# Altium footprint library Connectors Pad Lib.PcbLib: 211 footprints (part 11 of 14)
Each footprint in its own frame and in the unit in brackets; x right, y up, seen from the top. Pads: shape width x height; smd on the part's side, far side on the other; paste and mask are expansions set on the pad; w line width, h text height; cw(c..) or ccw(c..) is an arc to the next point about the centre after c.
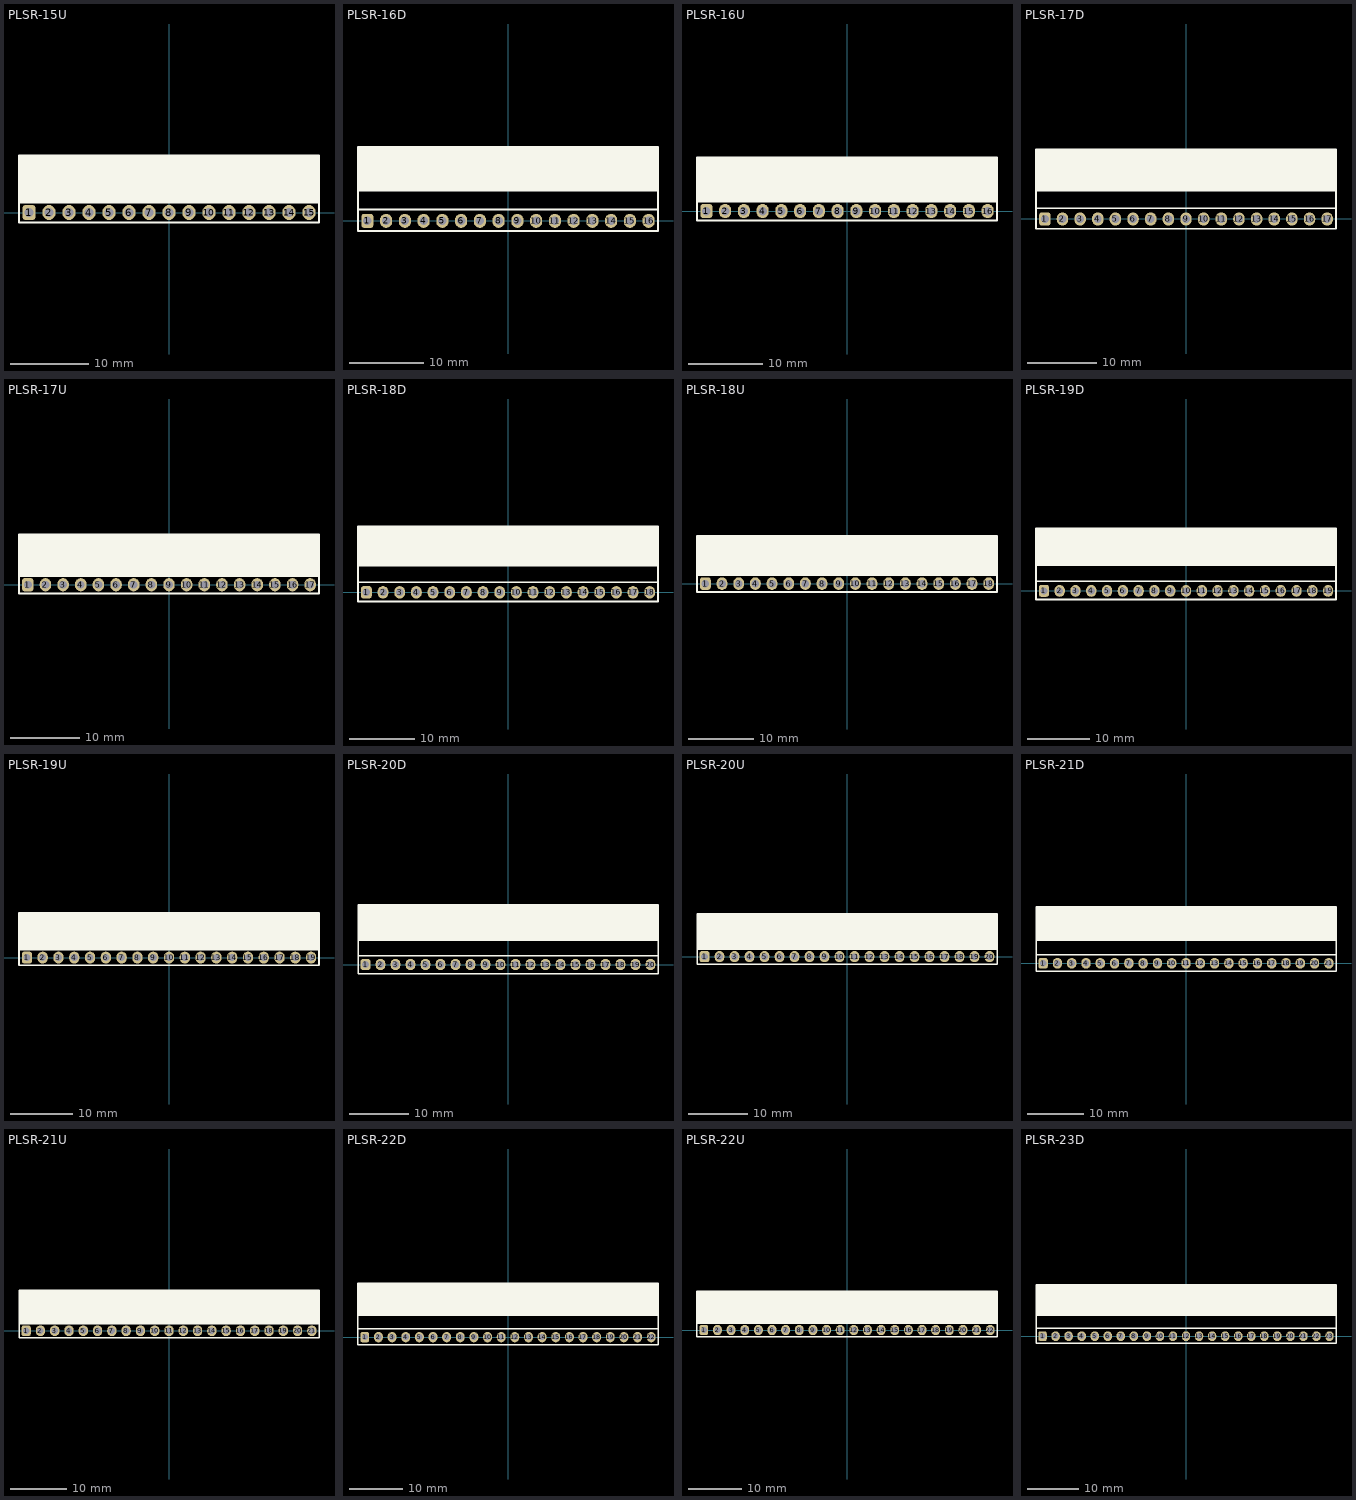
[diagram p10: the footprints below, top view; thin cyan lines are the x and y axes]

## PLSR-15U [mil] "PCB Right Angled Single Connector (U Type) 15-Pin"
height 236.3
pads (15):
  rrect50% 65x75 hole 45: 1(-700,0)
  oval 65x75 hole 45: 2(-600,0) 3(-500,0) 4(-400,0) 5(-300,0) 6(-200,0) 7(-100,0) 8(0,0) 9(100,0) 10(200,0) 11(300,0) 12(400,0) 13(500,0) 14(600,0) 15(700,0)
Top Overlay:
  rectangle: -750,50 750,285
  lines w10: -750,50 750,50 ; -750,-50 -750,285 750,285 750,-50 -750,-50
3D body "PLSRU-15.STEP": height 239.98, standoff -117.11, extent -750,-50 750,286.22

## PLSR-16D [mil] "PCB Right Angled Single Connector (D Type) 16-Pin"
height 98.42
pads (16):
  rrect50% 65x75 hole 45: 1(-750,0)
  oval 65x75 hole 45: 2(-650,0) 3(-550,0) 4(-450,0) 5(-350,0) 6(-250,0) 7(-150,0) 8(-50,0) 9(50,0) 10(150,0) 11(250,0) 12(350,0) 13(450,0) 14(550,0) 15(650,0) 16(750,0)
Top Overlay:
  rectangle: -800,161 800,395
  lines w10: -800,61 800,61 ; -800,161 800,161 ; -800,-55 800,-55 800,395 -800,395 -800,-55
3D body "PLSR-16D.STEP": height 101, standoff -117.11, extent -800,-11.02 800,396.85

## PLSR-16U [mil] "PCB Right Angled Single Connector (U Type) 16-Pin"
height 236.3
pads (16):
  rrect50% 65x75 hole 45: 1(-750,0)
  oval 65x75 hole 45: 2(-650,0) 3(-550,0) 4(-450,0) 5(-350,0) 6(-250,0) 7(-150,0) 8(-50,0) 9(50,0) 10(150,0) 11(250,0) 12(350,0) 13(450,0) 14(550,0) 15(650,0) 16(750,0)
Top Overlay:
  rectangle: -800,50 800,285
  lines w10: -800,50 800,50 ; -800,-50 800,-50 800,285 -800,285 -800,-50
3D body "PLSRU-16.STEP": height 239.98, standoff -117.11, extent -800,-50 800,286.22

## PLSR-17D [mil] "PCB Right Angled Single Connector (D Type) 17-Pin"
height 98.42
pads (17):
  rrect50% 65x75 hole 45: 1(-800,0)
  oval 65x75 hole 45: 2(-700,0) 3(-600,0) 4(-500,0) 5(-400,0) 6(-300,0) 7(-200,0) 8(-100,0) 9(0,0) 10(100,0) 11(200,0) 12(300,0) 13(400,0) 14(500,0) 15(600,0) 16(700,0) 17(800,0)
Top Overlay:
  rectangle: -850,161 850,395
  lines w10: -850,61 850,61 ; -850,161 850,161 ; -850,-55 -850,395 850,395 850,-55 -850,-55
3D body "PLSR-17D.STEP": height 101, standoff -117.11, extent -850,-11.02 850,396.85

## PLSR-17U [mil] "PCB Right Angled Single Connector (U Type) 17-Pin"
height 236.3
pads (17):
  rrect50% 65x75 hole 45: 1(-800,0)
  oval 65x75 hole 45: 2(-700,0) 3(-600,0) 4(-500,0) 5(-400,0) 6(-300,0) 7(-200,0) 8(-100,0) 9(0,0) 10(100,0) 11(200,0) 12(300,0) 13(400,0) 14(500,0) 15(600,0) 16(700,0) 17(800,0)
Top Overlay:
  rectangle: -850,50 850,285
  lines w10: -850,50 850,50 ; -850,-50 -850,285 850,285 850,-50 -850,-50
3D body "PLSRU-17.STEP": height 239.98, standoff -117.11, extent -850,-50 850,286.22

## PLSR-18D [mil] "PCB Right Angled Single Connector (D Type) 18-Pin"
height 98.42
pads (18):
  rrect50% 65x75 hole 45: 1(-850,0)
  oval 65x75 hole 45: 2(-750,0) 3(-650,0) 4(-550,0) 5(-450,0) 6(-350,0) 7(-250,0) 8(-150,0) 9(-50,0) 10(50,0) 11(150,0) 12(250,0) 13(350,0) 14(450,0) 15(550,0) 16(650,0) 17(750,0) 18(850,0)
Top Overlay:
  rectangle: -900,161 900,395
  lines w10: -900,61 900,61 ; -900,161 900,161 ; -900,-55 900,-55 900,395 -900,395 -900,-55
3D body "PLSR-18D.STEP": height 101, standoff -117.11, extent -900,-11.02 900,396.85

## PLSR-18U [mil] "PCB Right Angled Single Connector (U Type) 18-Pin"
height 236.3
pads (18):
  rrect50% 65x75 hole 45: 1(-850,0)
  oval 65x75 hole 45: 2(-750,0) 3(-650,0) 4(-550,0) 5(-450,0) 6(-350,0) 7(-250,0) 8(-150,0) 9(-50,0) 10(50,0) 11(150,0) 12(250,0) 13(350,0) 14(450,0) 15(550,0) 16(650,0) 17(750,0) 18(850,0)
Top Overlay:
  rectangle: -900,50 900,285
  lines w10: -900,50 900,50 ; -900,-50 900,-50 900,285 -900,285 -900,-50
3D body "PLSRU-18.STEP": height 239.98, standoff -117.11, extent -900,-50 900,286.22

## PLSR-19D [mil] "PCB Right Angled Single Connector (D Type) 19-Pin"
height 98.42
pads (19):
  rrect50% 65x75 hole 45: 1(-900,0)
  oval 65x75 hole 45: 2(-800,0) 3(-700,0) 4(-600,0) 5(-500,0) 6(-400,0) 7(-300,0) 8(-200,0) 9(-100,0) 10(0,0) 11(100,0) 12(200,0) 13(300,0) 14(400,0) 15(500,0) 16(600,0) 17(700,0) 18(800,0) 19(900,0)
Top Overlay:
  rectangle: -950,161 950,395
  lines w10: -950,61 950,61 ; -950,161 950,161 ; -950,-55 -950,395 950,395 950,-55 -950,-55
3D body "PLSR-19D.STEP": height 101, standoff -117.11, extent -950,-11.02 950,396.85

## PLSR-19U [mil] "PCB Right Angled Single Connector (U Type) 19-Pin"
height 236.3
pads (19):
  rrect50% 65x75 hole 45: 1(-900,0)
  oval 65x75 hole 45: 2(-800,0) 3(-700,0) 4(-600,0) 5(-500,0) 6(-400,0) 7(-300,0) 8(-200,0) 9(-100,0) 10(0,0) 11(100,0) 12(200,0) 13(300,0) 14(400,0) 15(500,0) 16(600,0) 17(700,0) 18(800,0) 19(900,0)
Top Overlay:
  rectangle: -950,50 950,285
  lines w10: -950,50 950,50 ; -950,-50 -950,285 950,285 950,-50 -950,-50
3D body "PLSRU-19.STEP": height 239.98, standoff -117.11, extent -950,-50 950,286.22

## PLSR-20D [mil] "PCB Right Angled Single Connector (D Type) 20-Pin"
height 98.42
pads (20):
  rrect50% 65x75 hole 45: 1(-950,0)
  oval 65x75 hole 45: 2(-850,0) 3(-750,0) 4(-650,0) 5(-550,0) 6(-450,0) 7(-350,0) 8(-250,0) 9(-150,0) 10(-50,0) 11(50,0) 12(150,0) 13(250,0) 14(350,0) 15(450,0) 16(550,0) 17(650,0) 18(750,0) 19(850,0) 20(950,0)
Top Overlay:
  rectangle: -1000,161 1000,400
  lines w10: -1000,60 1000,60 ; -1000,161 1000,161 ; -1000,-60 -1000,400 1000,400 1000,-60 -1000,-60
3D body "PLSR-20D.STEP": height 101, standoff -117.11, extent -1000,-11.02 1000,396.85

## PLSR-20U [mil] "PCB Right Angled Single Connector (U Type) 20-Pin"
height 236.3
pads (20):
  rrect50% 65x75 hole 45: 1(-950,0)
  oval 65x75 hole 45: 2(-850,0) 3(-750,0) 4(-650,0) 5(-550,0) 6(-450,0) 7(-350,0) 8(-250,0) 9(-150,0) 10(-50,0) 11(50,0) 12(150,0) 13(250,0) 14(350,0) 15(450,0) 16(550,0) 17(650,0) 18(750,0) 19(850,0) 20(950,0)
Top Overlay:
  rectangle: -1000,50 1000,285
  lines w10: -1000,50 1000,50 ; -1000,-50 -1000,285 1000,285 1000,-50 -1000,-50
3D body "PLSRU-20.STEP": height 239.98, standoff -117.11, extent -1000,-50 1000,286.22

## PLSR-21D [mil] "PCB Right Angled Single Connector (D Type) 21-Pin"
height 98.42
pads (21):
  rrect50% 65x75 hole 45: 1(-1000,0)
  oval 65x75 hole 45: 2(-900,0) 3(-800,0) 4(-700,0) 5(-600,0) 6(-500,0) 7(-400,0) 8(-300,0) 9(-200,0) 10(-100,0) 11(0,0) 12(100,0) 13(200,0) 14(300,0) 15(400,0) 16(500,0) 17(600,0) 18(700,0) 19(800,0) 20(900,0) 21(1000,0)
Top Overlay:
  rectangle: -1050,160 1050,395
  lines w10: -1050,61 1050,61 ; -1050,161 1050,161 ; -1050,-55 -1050,395 1050,395 1050,-55 -1050,-55
3D body "PLSR-21D.STEP": height 101, standoff -117.11, extent -1050,-11.02 1050,396.85

## PLSR-21U [mil] "PCB Right Angled Single Connector (U Type) 21-Pin"
height 236.3
pads (21):
  rrect50% 65x75 hole 45: 1(-1000,0)
  oval 65x75 hole 45: 2(-900,0) 3(-800,0) 4(-700,0) 5(-600,0) 6(-500,0) 7(-400,0) 8(-300,0) 9(-200,0) 10(-100,0) 11(0,0) 12(100,0) 13(200,0) 14(300,0) 15(400,0) 16(500,0) 17(600,0) 18(700,0) 19(800,0) 20(900,0) 21(1000,0)
Top Overlay:
  rectangle: -1050,50 1050,285
  lines w10: -1050,50 1050,50 ; -1050,-50 1050,-50 1050,285 -1050,285 -1050,-50
3D body "PLSRU-21.STEP": height 239.98, standoff -117.11, extent -1050,-50 1050,286.22

## PLSR-22D [mil] "PCB Right Angled Single Connector (D Type) 22-Pin"
height 98.42
pads (22):
  rrect50% 65x75 hole 45: 1(-1050,0)
  oval 65x75 hole 45: 2(-950,0) 3(-850,0) 4(-750,0) 5(-650,0) 6(-550,0) 7(-450,0) 8(-350,0) 9(-250,0) 10(-150,0) 11(-50,0) 12(50,0) 13(150,0) 14(250,0) 15(350,0) 16(450,0) 17(550,0) 18(650,0) 19(750,0) 20(850,0) 21(950,0) 22(1050,0)
Top Overlay:
  rectangle: -1100,160 1100,395
  lines w10: -1100,61 1100,61 ; -1100,161 1100,161 ; -1100,-55 -1100,395 1100,395 1100,-55 -1100,-55
3D body "PLSR-22D.STEP": height 101, standoff -117.11, extent -1100,-11.02 1100,396.85

## PLSR-22U [mil] "PCB Right Angled Single Connector (U Type) 22-Pin"
height 236.3
pads (22):
  rrect50% 65x75 hole 45: 1(-1050,0)
  oval 65x75 hole 45: 2(-950,0) 3(-850,0) 4(-750,0) 5(-650,0) 6(-550,0) 7(-450,0) 8(-350,0) 9(-250,0) 10(-150,0) 11(-50,0) 12(50,0) 13(150,0) 14(250,0) 15(350,0) 16(450,0) 17(550,0) 18(650,0) 19(750,0) 20(850,0) 21(950,0) 22(1050,0)
Top Overlay:
  rectangle: -1100,50 1100,285
  lines w10: -1100,50 1100,50 ; -1100,-50 -1100,285 1100,285 1100,-50 -1100,-50
3D body "PLSRU-22.STEP": height 239.98, standoff -117.11, extent -1100,-50 1100,286.22

## PLSR-23D [mil] "PCB Right Angled Single Connector (D Type) 23-Pin"
height 98.42
pads (23):
  rrect50% 65x75 hole 45: 1(-1100,0)
  oval 65x75 hole 45: 2(-1000,0) 3(-900,0) 4(-800,0) 5(-700,0) 6(-600,0) 7(-500,0) 8(-400,0) 9(-300,0) 10(-200,0) 11(-100,0) 12(0,0) 13(100,0) 14(200,0) 15(300,0) 16(400,0) 17(500,0) 18(600,0) 19(700,0) 20(800,0) 21(900,0) 22(1000,0) 23(1100,0)
Top Overlay:
  rectangle: -1150,160 1150,395
  lines w10: -1150,61 1150,61 ; -1150,161 1150,161 ; -1150,-55 -1150,395 1150,395 1150,-55 -1150,-55
3D body "PLSR-23D.STEP": height 101, standoff -117.11, extent -1150,-11.02 1150,396.85